# Altium footprint library AMAP4BPXEVBv2.PcbLib: 58 footprints (part 1 of 4)
Each footprint in its own frame and in the unit in brackets; x right, y up, seen from the top. Pads: shape width x height; smd on the part's side, far side on the other; paste and mask are expansions set on the pad; w line width, h text height; cw(c..) or ccw(c..) is an arc to the next point about the centre after c.
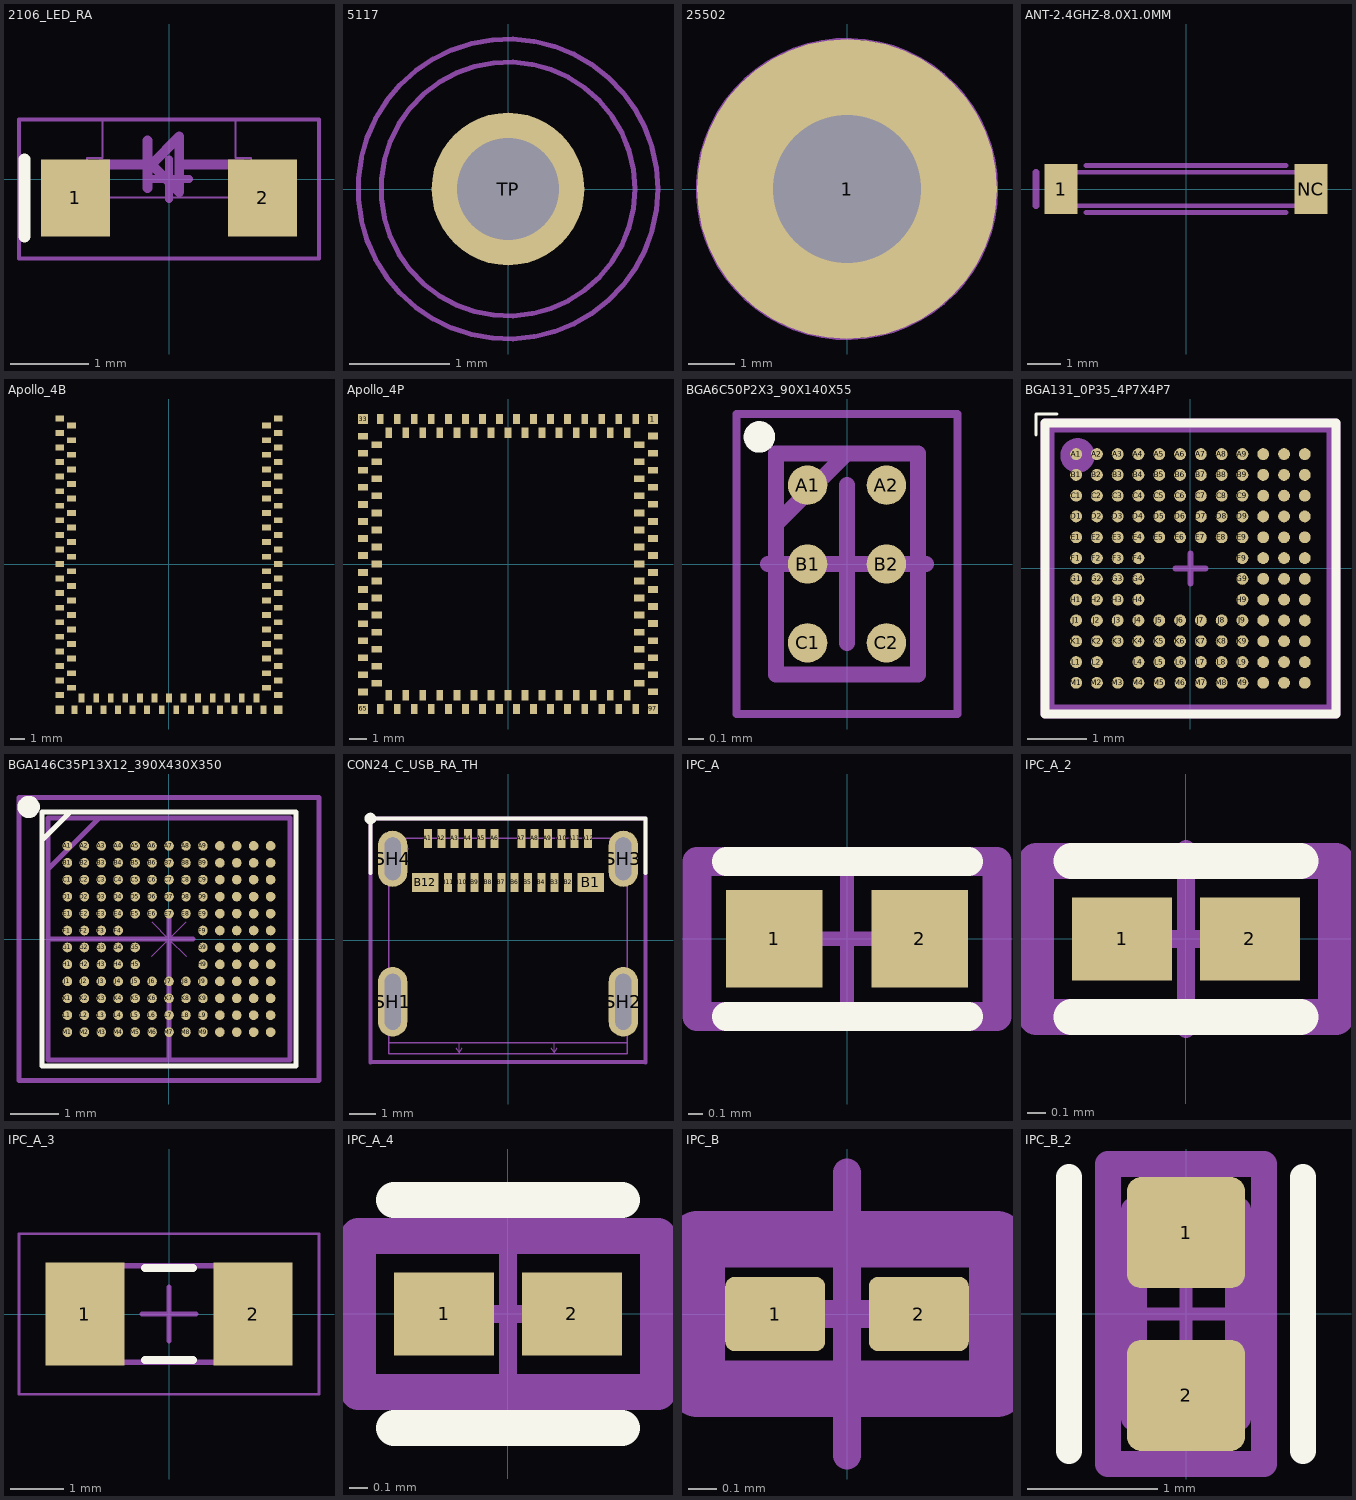
[diagram p0: the footprints below, top view; thin cyan lines are the x and y axes]

## 2106_LED_RA [mil] "2106_LED_RA"
pads (2):
  rect 35x39 smd mask+1.97: 1(-47.2,-9.5) 2(47.2,-9.5)
Top Overlay:
  lines w6: -72.96,-28.96 -72.96,10
  text ".Designator" at -85,-28.5 h40
Top Assembly:
  lines w0.98: -41.49,10.67 -33.49,10.67 ; 33.51,10.67 41.51,10.67
  lines w1: -41.49,10.67 -41.49,-9.33 41.51,-9.33 41.51,10.67 ; -33.49,10.67 -33.49,29.67 33.51,29.67 33.51,10.67
  lines w5: -34.83,7.44 -8.83,7.44 ; -10.83,-4.56 -10.83,7.44 -10.83,19.44 ; 7.17,7.44 37.17,7.44 ; -8.83,7.44 5.17,-6.56 5.17,21.44 -8.83,7.44
  text ".Designator" at 9.05,-132.63 h40
Top Courtyard:
  lines w2: -75.7,-40 -75.7,30 75.7,30 75.7,-40 -75.7,-40
Top Component Center:
  lines w4: -10,0 10,0 ; 0,-10 0,10
3D body "APA2107.STEP": height 23.62, standoff 0, extent -41.34,-9.88 41.34,29.53

## 5117 [mm] "Through hole test point footprint"
pads (1):
  round 1.528 hole 1.02: TP(0,0)
Top Overlay:
  text ".Designator" at 1.143,-0.109 h0.5
Top Assembly:
  circle w0.05: c0,0 r1.27
  text ".Designator" at -0.432,-0.084 h0.5
Top Courtyard:
  circle w0.05: c0,0 r1.5
Top Component Center:
  lines w0.02: -0.052,-0.052 0,0 ; -0.052,0.052 0,0 ; 0.052,-0.052 0,0 ; 0.052,0.052 0,0
3D body "5117.STEP": height 3.18, standoff -4.44, extent -1.261,-1.27 1.279,1.27

## 25502 [mm] "Hex Standoff Threaded M3 Nylon 0.472\" (12.00mm) Natural"
height 12
pads (1):
  round 6.5 hole 3.2: 1(0,0)
Top Assembly:
  circle w0.05: c0,0 r3.25
  text "'.Designator'" at -0.762,1.686 h1
  text "M3 Standoff" at -2.413,-0.624 h1
Mechanical 3:
  circle w0.05: c0,0 r3.25
  circle w0.05: c0,0 r1.6
Top Courtyard:
  circle w0.05: c0,0 r3.25
Top Component Center:
  lines w0.1: -0.354,-0.354 0,0 ; -0.354,0.354 0,0 ; 0.354,-0.354 0,0 ; 0.354,0.354 0,0
3D body "keystone-PN25502.STEP": height 7, standoff -13, extent -2.887,-2.5 2.887,2.5

## ANT-2.4GHZ-8.0X1.0MM [mm] "ANT-2.4GHZ-8.0X1.0MM"
pads (2):
  rect 1x1.5 smd: 1(-3.75,0) NC(3.75,0)
Mechanical 3:
  lines w0.127: -4,-0.5 -4,0.5 4,0.5 4,-0.5 -4,-0.5
Mechanical 7:
  lines w0.152: -3,-0.7 3,-0.7 ; -3,0.7 3,0.7
  lines w0.203: -4.5,-0.5 -4.5,0.5
3D body "3sAp-L1.step": height 1, standoff 0, extent -4.85,-1 4.65,1.1

## Apollo_4B [mm]
pads (107):
  rect 0.6x0.4 smd: 0(-7.5,10) 1(-6.7,9.5) 2(-7.5,9) 3(-6.7,8.5) 4(-7.5,8) 5(-6.7,7.5) 6(-7.5,7) 7(-6.7,6.5) 8(-7.5,6) 9(-6.7,5.5) 10(-7.5,5) 11(-6.7,4.5) 12(-7.5,4) 13(-6.7,3.5) 14(-7.5,3) 15(-6.7,2.5) 16(-7.5,2) 17(-6.7,1.5) 18(-7.5,1) 19(-6.7,0.5) 20(-7.5,0) 21(-6.7,-0.5) 22(-7.5,-1) 23(-6.7,-1.5) 24(-7.5,-2) 25(-6.7,-2.5) 26(-7.5,-3) 27(-6.7,-3.5) 28(-7.5,-4) 29(-6.7,-4.5) 30(-7.5,-5) 31(-6.7,-5.5) 32(-7.5,-6) 33(-6.7,-6.5) 34(-7.5,-7) 35(-6.7,-7.5) 36(-7.5,-8) 37(-6.7,-8.5) 38(-7.5,-9) 68(7.5,-9) 69(6.7,-8.5) 70(7.5,-8) 71(6.7,-7.5) 72(7.5,-7) 73(6.7,-6.5) 74(7.5,-6) 75(6.7,-5.5) 76(7.5,-5) 77(6.7,-4.5) 78(7.5,-4) 79(6.7,-3.5) 80(7.5,-3) 81(6.7,-2.5) 82(7.5,-2) 83(6.7,-1.5) 84(7.5,-1) 85(6.7,-0.5) 86(7.5,0) 87(6.7,0.5) 88(7.5,1) 89(6.7,1.5) 90(7.5,2) 91(6.7,2.5) 92(7.5,3) 93(6.7,3.5) 94(7.5,4) 95(6.7,4.5) 96(7.5,5) 97(6.7,5.5) 98(7.5,6) 99(6.7,6.5) 100(7.5,7) 101(6.7,7.5) 102(7.5,8) 103(6.7,8.5) 104(7.5,9) 105(6.7,9.5) 106(7.5,10)
  rect 0.6x0.6 smd: 39(-7.5,-10) 67(7.5,-10)
  rect 0.4x0.6 smd: 40(-6.5,-10) 41(-6,-9.2) 42(-5.5,-10) 43(-5,-9.2) 44(-4.5,-10) 45(-4,-9.2) 46(-3.5,-10) 47(-3,-9.2) 48(-2.5,-10) 49(-2,-9.2) 50(-1.5,-10) 51(-1,-9.2) 52(-0.5,-10) 53(0,-9.2) 54(0.5,-10) 55(1,-9.2) 56(1.5,-10) 57(2,-9.2) 58(2.5,-10) 59(3,-9.2) 60(3.5,-10) 61(4,-9.2) 62(4.5,-10) 63(5,-9.2) 64(5.5,-10) 65(6,-9.2) 66(6.5,-10)

## Apollo_4P [mm]
pads (128):
  rect 0.6x0.6 smd: 1(8.5,8.5) 33(-8.5,8.5) 65(-8.5,-8.5) 97(8.5,-8.5)
  rect 0.4x0.6 smd: 2(7.5,8.5) 3(7,7.7) 4(6.5,8.5) 5(6,7.7) 6(5.5,8.5) 7(5,7.7) 8(4.5,8.5) 9(4,7.7) 10(3.5,8.5) 11(3,7.7) 12(2.5,8.5) 13(2,7.7) 14(1.5,8.5) 15(1,7.7) 16(0.5,8.5) 17(0,7.7) 18(-0.5,8.5) 19(-1,7.7) 20(-1.5,8.5) 21(-2,7.7) 22(-2.5,8.5) 23(-3,7.7) 24(-3.5,8.5) 25(-4,7.7) 26(-4.5,8.5) 27(-5,7.7) 28(-5.5,8.5) 29(-6,7.7) 30(-6.5,8.5) 31(-7,7.7) 32(-7.5,8.5) 66(-7.5,-8.5) 67(-7,-7.7) 68(-6.5,-8.5) 69(-6,-7.7) 70(-5.5,-8.5) 71(-5,-7.7) 72(-4.5,-8.5) 73(-4,-7.7) 74(-3.5,-8.5) 75(-3,-7.7) 76(-2.5,-8.5) 77(-2,-7.7) 78(-1.5,-8.5) 79(-1,-7.7) 80(-0.5,-8.5) 81(0,-7.7) 82(0.5,-8.5) 83(1,-7.7) 84(1.5,-8.5) 85(2,-7.7) 86(2.5,-8.5) 87(3,-7.7) 88(3.5,-8.5) 89(4,-7.7) 90(4.5,-8.5) 91(5,-7.7) 92(5.5,-8.5) 93(6,-7.7) 94(6.5,-8.5) 95(7,-7.7) 96(7.5,-8.5)
  rect 0.6x0.4 smd: 34(-8.5,7.5) 35(-7.7,7) 36(-8.5,6.5) 37(-7.7,6) 38(-8.5,5.5) 39(-7.7,5) 40(-8.5,4.5) 41(-7.7,4) 42(-8.5,3.5) 43(-7.7,3) 44(-8.5,2.5) 45(-7.7,2) 46(-8.5,1.5) 47(-7.7,1) 48(-8.5,0.5) 49(-7.7,0) 50(-8.5,-0.5) 51(-7.7,-1) 52(-8.5,-1.5) 53(-7.7,-2) 54(-8.5,-2.5) 55(-7.7,-3) 56(-8.5,-3.5) 57(-7.7,-4) 58(-8.5,-4.5) 59(-7.7,-5) 60(-8.5,-5.5) 61(-7.7,-6) 62(-8.5,-6.5) 63(-7.7,-7) 64(-8.5,-7.5) 98(8.5,-7.5) 99(7.7,-7) 100(8.5,-6.5) 101(7.7,-6) 102(8.5,-5.5) 103(7.7,-5) 104(8.5,-4.5) 105(7.7,-4) 106(8.5,-3.5) 107(7.7,-3) 108(8.5,-2.5) 109(7.7,-2) 110(8.5,-1.5) 111(7.7,-1) 112(8.5,-0.5) 113(7.7,0) 114(8.5,0.5) 115(7.7,1) 116(8.5,1.5) 117(7.7,2) 118(8.5,2.5) 119(7.7,3) 120(8.5,3.5) 121(7.7,4) 122(8.5,4.5) 123(7.7,5) 124(8.5,5.5) 125(7.7,6) 126(8.5,6.5) 127(7.7,7) 128(8.5,7.5)

## BGA6C50P2X3_90X140X55 [mm] "BGA, 6-Leads, Body 0.90x1.40mmx0.55mm, Pitch 0.50mm"
height 0.56
pads (6):
  round 0.25 smd mask+0.05: A1(-0.25,0.5) A2(0.25,0.5) B1(-0.25,0) B2(0.25,0) C1(-0.25,-0.5) C2(0.25,-0.5)
Top Overlay:
  circle w0.1: c-0.555,0.805 r0.05
  text ".Designator" at 0.103,-2.71 h1.02
Top Assembly:
  lines w0.1: -0.45,-0.7 0.45,-0.7 0.45,0.7 -0.45,0.7 -0.45,-0.7
  lines w0.102: -0.448,0.254 0,0.7
  text ".Designator" at 0.139,-2.464 h1.02
Top Courtyard:
  lines w0.05: -0.7,-0.95 0.7,-0.95 0.7,0.95 -0.7,0.95 -0.7,-0.95
Top Component Center:
  lines w0.1: -0.5,0 0.5,0 ; 0,-0.5 0,0.5
3D body "BGA6C50P2X3_90X140X55.step": height 0.55, standoff 0, extent -0.45,-0.7 0.45,0.7

## BGA131_0P35_4P7X4P7 [mm] "BGA131_0P35_4P7X4P7"
pads (131):
  round 0.2 smd mask+0.03: A1(-1.925,1.925) A2(-1.575,1.925) A3(-1.225,1.925) A4(-0.875,1.925) A5(-0.525,1.925) A6(-0.175,1.925) A7(0.175,1.925) A8(0.525,1.925) A9(0.875,1.925) A10(1.225,1.925) A11(1.575,1.925) A12(1.925,1.925) B1(-1.925,1.575) B2(-1.575,1.575) B3(-1.225,1.575) B4(-0.875,1.575) B5(-0.525,1.575) B6(-0.175,1.575) B7(0.175,1.575) B8(0.525,1.575) B9(0.875,1.575) B10(1.225,1.575) B11(1.575,1.575) B12(1.925,1.575) C1(-1.925,1.225) C2(-1.575,1.225) C3(-1.225,1.225) C4(-0.875,1.225) C5(-0.525,1.225) C6(-0.175,1.225) C7(0.175,1.225) C8(0.525,1.225) C9(0.875,1.225) C10(1.225,1.225) C11(1.575,1.225) C12(1.925,1.225) D1(-1.925,0.875) D2(-1.575,0.875) D3(-1.225,0.875) D4(-0.875,0.875) D5(-0.525,0.875) D6(-0.175,0.875) D7(0.175,0.875) D8(0.525,0.875) D9(0.875,0.875) D10(1.225,0.875) D11(1.575,0.875) D12(1.925,0.875) E1(-1.925,0.525) E2(-1.575,0.525) E3(-1.225,0.525) E4(-0.875,0.525) E5(-0.525,0.525) E6(-0.175,0.525) E7(0.175,0.525) E8(0.525,0.525) E9(0.875,0.525) E10(1.225,0.525) E11(1.575,0.525) E12(1.925,0.525) F1(-1.925,0.175) F2(-1.575,0.175) F3(-1.225,0.175) F4(-0.875,0.175) F9(0.875,0.175) F10(1.225,0.175) F11(1.575,0.175) F12(1.925,0.175) G1(-1.925,-0.175) G2(-1.575,-0.175) G3(-1.225,-0.175) G4(-0.875,-0.175) G9(0.875,-0.175) G10(1.225,-0.175) G11(1.575,-0.175) G12(1.925,-0.175) H1(-1.925,-0.525) H2(-1.575,-0.525) H3(-1.225,-0.525) H4(-0.875,-0.525) H9(0.875,-0.525) H10(1.225,-0.525) H11(1.575,-0.525) H12(1.925,-0.525) J1(-1.925,-0.875) J2(-1.575,-0.875) J3(-1.225,-0.875) J4(-0.875,-0.875) J5(-0.525,-0.875) J6(-0.175,-0.875) J7(0.175,-0.875) J8(0.525,-0.875) J9(0.875,-0.875) J10(1.225,-0.875) J11(1.575,-0.875) J12(1.925,-0.875) K1(-1.925,-1.225) K2(-1.575,-1.225) K3(-1.225,-1.225) K4(-0.875,-1.225) K5(-0.525,-1.225) K6(-0.175,-1.225) K7(0.175,-1.225) K8(0.525,-1.225) K9(0.875,-1.225) K10(1.225,-1.225) K11(1.575,-1.225) K12(1.925,-1.225) L1(-1.925,-1.575) L2(-1.575,-1.575) L4(-0.875,-1.575) L5(-0.525,-1.575) L6(-0.175,-1.575) L7(0.175,-1.575) L8(0.525,-1.575) L9(0.875,-1.575) L10(1.225,-1.575) L11(1.575,-1.575) L12(1.925,-1.575) M1(-1.925,-1.925) M2(-1.575,-1.925) M3(-1.225,-1.925) M4(-0.875,-1.925) M5(-0.525,-1.925) M6(-0.175,-1.925) M7(0.175,-1.925) M8(0.525,-1.925) M9(0.875,-1.925) M10(1.225,-1.925) M11(1.575,-1.925) M12(1.925,-1.925)
Top Overlay:
  lines w0.05: -2.6,2.25 -2.6,2.6 -2.25,2.6
  lines w0.152: -2.45,-2.45 -2.45,2.45 2.45,2.45 2.45,-2.45 -2.45,-2.45
  text ".Designator" at 2.678,-2.983 h3.81
Top Assembly:
  circle w0.381: c-1.901,1.901 r0.1
  lines w0.127: -2.35,-2.35 -2.35,2.35 2.35,2.35 2.35,-2.35 -2.35,-2.35
  text ".Designator" at 0.142,2.336 h1.02
Top Courtyard:
  lines w0.152: -2.45,-2.45 -2.45,2.45 2.45,2.45 2.45,-2.45 -2.45,-2.45
Top Component Center:
  lines w0.102: -0.254,0 0.254,0 ; 0,-0.254 0,0.254
3D body: height 0.5, standoff 0, extent -2.45,-2.45 2.45,2.45

## BGA146C35P13X12_390X430X350 [mm] "BGA, 146-Leads, Body 3.91x4.31mmx3.50mm, Pitch 0.35mm"
height 3.5
pads (146):
  round 0.2 smd paste+0 mask+0.03: A1(-2.1,1.925) A2(-1.75,1.925) A3(-1.4,1.925) A4(-1.05,1.925) A5(-0.7,1.925) A6(-0.35,1.925) A7(0,1.925) A8(0.35,1.925) A9(0.7,1.925) A10(1.05,1.925) A11(1.4,1.925) A12(1.75,1.925) A13(2.1,1.925) B1(-2.1,1.575) B2(-1.75,1.575) B3(-1.4,1.575) B4(-1.05,1.575) B5(-0.7,1.575) B6(-0.35,1.575) B7(0,1.575) B8(0.35,1.575) B9(0.7,1.575) B10(1.05,1.575) B11(1.4,1.575) B12(1.75,1.575) B13(2.1,1.575) C1(-2.1,1.225) C2(-1.75,1.225) C3(-1.4,1.225) C4(-1.05,1.225) C5(-0.7,1.225) C6(-0.35,1.225) C7(0,1.225) C8(0.35,1.225) C9(0.7,1.225) C10(1.05,1.225) C11(1.4,1.225) C12(1.75,1.225) C13(2.1,1.225) D1(-2.1,0.875) D2(-1.75,0.875) D3(-1.4,0.875) D4(-1.05,0.875) D5(-0.7,0.875) D6(-0.35,0.875) D7(0,0.875) D8(0.35,0.875) D9(0.7,0.875) D10(1.05,0.875) D11(1.4,0.875) D12(1.75,0.875) D13(2.1,0.875) E1(-2.1,0.525) E2(-1.75,0.525) E3(-1.4,0.525) E4(-1.05,0.525) E5(-0.7,0.525) E6(-0.35,0.525) E7(0,0.525) E8(0.35,0.525) E9(0.7,0.525) E10(1.05,0.525) E11(1.4,0.525) E12(1.75,0.525) E13(2.1,0.525) F1(-2.1,0.175) F2(-1.75,0.175) F3(-1.4,0.175) F4(-1.05,0.175) F9(0.7,0.175) F10(1.05,0.175) F11(1.4,0.175) F12(1.75,0.175) F13(2.1,0.175) G1(-2.1,-0.175) G2(-1.75,-0.175) G3(-1.4,-0.175) G4(-1.05,-0.175) G5(-0.7,-0.175) G9(0.7,-0.175) G10(1.05,-0.175) G11(1.4,-0.175) G12(1.75,-0.175) G13(2.1,-0.175) H1(-2.1,-0.525) H2(-1.75,-0.525) H3(-1.4,-0.525) H4(-1.05,-0.525) H5(-0.7,-0.525) H9(0.7,-0.525) H10(1.05,-0.525) H11(1.4,-0.525) H12(1.75,-0.525) H13(2.1,-0.525) J1(-2.1,-0.875) J2(-1.75,-0.875) J3(-1.4,-0.875) J4(-1.05,-0.875) J5(-0.7,-0.875) J6(-0.35,-0.875) J7(0,-0.875) J8(0.35,-0.875) J9(0.7,-0.875) J10(1.05,-0.875) J11(1.4,-0.875) J12(1.75,-0.875) J13(2.1,-0.875) K1(-2.1,-1.225) K2(-1.75,-1.225) K3(-1.4,-1.225) K4(-1.05,-1.225) K5(-0.7,-1.225) K6(-0.35,-1.225) K7(0,-1.225) K8(0.35,-1.225) K9(0.7,-1.225) K10(1.05,-1.225) K11(1.4,-1.225) K12(1.75,-1.225) K13(2.1,-1.225) L1(-2.1,-1.575) L2(-1.75,-1.575) L3(-1.4,-1.575) L4(-1.05,-1.575) L5(-0.7,-1.575) L6(-0.35,-1.575) L7(0,-1.575) L8(0.35,-1.575) L9(0.7,-1.575) L10(1.05,-1.575) L11(1.4,-1.575) L12(1.75,-1.575) L13(2.1,-1.575) M1(-2.1,-1.925) M2(-1.75,-1.925) M3(-1.4,-1.925) M4(-1.05,-1.925) M5(-0.7,-1.925) M6(-0.35,-1.925) M7(0,-1.925) M8(0.35,-1.925) M9(0.7,-1.925) M10(1.05,-1.925) M11(1.4,-1.925) M12(1.75,-1.925) M13(2.1,-1.925)
Top Overlay:
  circle w0.25: c-2.899,2.73 r0.106
  lines w0.102: -2.625,2.051 -2.615,2.051 -2.042,2.625 -2.048,2.625 ; -2.625,-2.625 -2.625,2.625 2.625,2.625 2.625,-2.625 -2.625,-2.625
  text ".Designator" at 3.568,-0.339 h1.52
Top Assembly:
  lines w0.102: -2.5,1.444 -1.447,2.497 ; -2.282,2.5 -2.276,2.5 ; -2.5,-2.5 -2.5,0 0,0 0,-2.5 -2.5,-2.5 ; -2.5,-2.5 -2.5,2.5 2.5,2.5 2.5,-2.5 -2.5,-2.5
  text "MRAM Location Quadrant" at -2.511,-2.5 h0.51
  text ".Designator" at 1.074,-0.654 h1
Top Courtyard:
  lines w0.102: -3.1,-2.925 -3.1,2.925 3.1,2.925 3.1,-2.925 -3.1,-2.925
Top Component Center:
  lines w0.025: -0.354,-0.354 0,0 ; -0.354,0.354 0,0 ; 0.354,-0.354 0,0 ; 0.354,0.354 0,0
  lines w0.1: -0.5,0 0,0 ; 0,-0.5 0,0 ; 0,0.5 0,0 ; 0.5,0 0,0
3D body: height 0.4, standoff 0, extent 0.15,0.325 0.55,0.725
3D body: height 0.4, standoff 0, extent 0.15,0.675 0.55,1.075
3D body: height 0.4, standoff 0, extent 0.5,-0.025 0.9,0.375
3D body: height 0.4, standoff 0, extent 0.5,0.325 0.9,0.725
3D body: height 0.4, standoff 0, extent 0.5,0.675 0.9,1.075
3D body: height 0.4, standoff 0, extent 0.5,1.025 0.9,1.425
3D body: height 0.4, standoff 0, extent 0.5,1.375 0.9,1.775
3D body: height 0.4, standoff 0, extent 0.5,1.725 0.9,2.125
3D body: height 0.4, standoff 0, extent 0.5,-0.375 0.9,0.025
3D body: height 0.4, standoff 0, extent 0.5,-0.725 0.9,-0.325
3D body: height 0.4, standoff 0, extent 0.5,-1.075 0.9,-0.675
3D body: height 0.4, standoff 0, extent 0.15,-1.075 0.55,-0.675
3D body: height 0.4, standoff 0, extent -0.2,-1.075 0.2,-0.675
3D body: height 0.4, standoff 0, extent -0.55,-1.075 -0.15,-0.675
3D body: height 0.4, standoff 0, extent -0.9,-1.075 -0.5,-0.675
3D body: height 0.4, standoff 0, extent -0.9,-0.725 -0.5,-0.325
3D body: height 0.4, standoff 0, extent -0.9,-0.375 -0.5,0.025
3D body: height 0.4, standoff 0, extent 1.2,-1.425 1.6,-1.025
3D body: height 0.4, standoff 0, extent 1.2,-1.775 1.6,-1.375
3D body: height 0.4, standoff 0, extent 1.2,-2.125 1.6,-1.725
3D body: height 0.4, standoff 0, extent -0.2,0.325 0.2,0.725
3D body: height 0.4, standoff 0, extent -0.55,0.325 -0.15,0.725
3D body: height 0.4, standoff 0, extent -0.9,0.325 -0.5,0.725
3D body: height 0.4, standoff 0, extent -0.2,0.675 0.2,1.075
3D body: height 0.4, standoff 0, extent -0.55,0.675 -0.15,1.075
3D body: height 0.4, standoff 0, extent -0.9,0.675 -0.5,1.075
3D body: height 0.4, standoff 0, extent 0.85,1.025 1.25,1.425
3D body: height 0.4, standoff 0, extent 0.85,1.375 1.25,1.775
3D body: height 0.4, standoff 0, extent 0.85,1.725 1.25,2.125
3D body: height 0.4, standoff 0, extent 1.2,1.025 1.6,1.425
3D body: height 0.4, standoff 0, extent 1.2,1.375 1.6,1.775
3D body: height 0.4, standoff 0, extent 1.2,1.725 1.6,2.125
3D body: height 0.58, standoff 0.18, extent -2.5,-2.5 2.5,2.5
3D body: height 0.4, standoff 0, extent 1.9,-0.025 2.3,0.375
3D body: height 0.4, standoff 0, extent 1.9,0.325 2.3,0.725
3D body: height 0.4, standoff 0, extent 1.9,0.675 2.3,1.075
3D body: height 0.4, standoff 0, extent 1.55,-0.025 1.95,0.375
3D body: height 0.4, standoff 0, extent 1.55,0.325 1.95,0.725
3D body: height 0.4, standoff 0, extent 1.55,0.675 1.95,1.075
3D body: height 0.4, standoff 0, extent 1.2,-0.025 1.6,0.375
3D body: height 0.4, standoff 0, extent 1.2,0.325 1.6,0.725
3D body: height 0.4, standoff 0, extent 1.2,0.675 1.6,1.075
3D body: height 0.4, standoff 0, extent 0.85,-0.025 1.25,0.375
3D body: height 0.4, standoff 0, extent 0.85,0.325 1.25,0.725
3D body: height 0.4, standoff 0, extent 0.85,0.675 1.25,1.075
3D body: height 0.4, standoff 0, extent 1.9,-1.075 2.3,-0.675
3D body: height 0.4, standoff 0, extent 1.9,-0.725 2.3,-0.325
3D body: height 0.4, standoff 0, extent 1.9,-0.375 2.3,0.025
3D body: height 0.4, standoff 0, extent 1.55,-1.075 1.95,-0.675
3D body: height 0.4, standoff 0, extent 1.55,-0.725 1.95,-0.325
3D body: height 0.4, standoff 0, extent 1.55,-0.375 1.95,0.025
3D body: height 0.4, standoff 0, extent 1.2,-1.075 1.6,-0.675
3D body: height 0.4, standoff 0, extent 1.2,-0.725 1.6,-0.325
3D body: height 0.4, standoff 0, extent 1.2,-0.375 1.6,0.025
3D body: height 0.4, standoff 0, extent 0.85,-1.075 1.25,-0.675
3D body: height 0.4, standoff 0, extent 0.85,-0.725 1.25,-0.325
3D body: height 0.4, standoff 0, extent 0.85,-0.375 1.25,0.025
3D body: height 0.4, standoff 0, extent 0.85,-2.125 1.25,-1.725
3D body: height 0.4, standoff 0, extent 0.85,-1.775 1.25,-1.375
3D body: height 0.4, standoff 0, extent 0.85,-1.425 1.25,-1.025
3D body: height 0.4, standoff 0, extent 0.5,-2.125 0.9,-1.725
3D body: height 0.4, standoff 0, extent 0.5,-1.775 0.9,-1.375
3D body: height 0.4, standoff 0, extent 0.5,-1.425 0.9,-1.025
3D body: height 0.4, standoff 0, extent 0.15,-2.125 0.55,-1.725
3D body: height 0.4, standoff 0, extent 0.15,-1.775 0.55,-1.375
3D body: height 0.4, standoff 0, extent 0.15,-1.425 0.55,-1.025
3D body: height 0.4, standoff 0, extent -0.2,-2.125 0.2,-1.725
3D body: height 0.4, standoff 0, extent -0.2,-1.775 0.2,-1.375
3D body: height 0.4, standoff 0, extent -0.2,-1.425 0.2,-1.025
3D body: height 0.4, standoff 0, extent -0.55,-2.125 -0.15,-1.725
3D body: height 0.4, standoff 0, extent -0.55,-1.775 -0.15,-1.375
3D body: height 0.4, standoff 0, extent -0.55,-1.425 -0.15,-1.025
3D body: height 0.4, standoff 0, extent -0.9,-2.125 -0.5,-1.725
3D body: height 0.4, standoff 0, extent -0.9,-1.775 -0.5,-1.375
3D body: height 0.4, standoff 0, extent -0.9,-1.425 -0.5,-1.025
3D body: height 0.4, standoff 0, extent -1.25,-2.125 -0.85,-1.725
3D body: height 0.4, standoff 0, extent -1.25,-1.775 -0.85,-1.375
3D body: height 0.4, standoff 0, extent -1.25,-1.425 -0.85,-1.025
3D body: height 0.4, standoff 0, extent -1.6,-2.125 -1.2,-1.725
3D body: height 0.4, standoff 0, extent -1.6,-1.775 -1.2,-1.375
3D body: height 0.4, standoff 0, extent -1.6,-1.425 -1.2,-1.025
3D body: height 0.4, standoff 0, extent -1.25,-1.075 -0.85,-0.675
3D body: height 0.4, standoff 0, extent -1.25,-0.725 -0.85,-0.325
3D body: height 0.4, standoff 0, extent -1.25,-0.375 -0.85,0.025
3D body: height 0.4, standoff 0, extent -1.6,-1.075 -1.2,-0.675
3D body: height 0.4, standoff 0, extent -1.6,-0.725 -1.2,-0.325
3D body: height 0.4, standoff 0, extent -1.6,-0.375 -1.2,0.025
3D body: height 0.4, standoff 0, extent -1.95,-1.075 -1.55,-0.675
3D body: height 0.4, standoff 0, extent -1.95,-0.725 -1.55,-0.325
3D body: height 0.4, standoff 0, extent -1.95,-0.375 -1.55,0.025
3D body: height 0.4, standoff 0, extent -2.3,-1.075 -1.9,-0.675
3D body: height 0.4, standoff 0, extent -2.3,-0.725 -1.9,-0.325
3D body: height 0.4, standoff 0, extent -2.3,-0.375 -1.9,0.025
3D body: height 0.4, standoff 0, extent -1.25,-0.025 -0.85,0.375
3D body: height 0.4, standoff 0, extent -1.25,0.325 -0.85,0.725
3D body: height 0.4, standoff 0, extent -1.25,0.675 -0.85,1.075
3D body: height 0.4, standoff 0, extent -1.6,-0.025 -1.2,0.375
3D body: height 0.4, standoff 0, extent -1.6,0.325 -1.2,0.725
3D body: height 0.4, standoff 0, extent -1.6,0.675 -1.2,1.075
3D body: height 0.4, standoff 0, extent -1.95,-0.025 -1.55,0.375
3D body: height 0.4, standoff 0, extent -1.95,0.325 -1.55,0.725
3D body: height 0.4, standoff 0, extent -1.95,0.675 -1.55,1.075
3D body: height 0.4, standoff 0, extent -2.3,-0.025 -1.9,0.375
3D body: height 0.4, standoff 0, extent -2.3,0.325 -1.9,0.725
3D body: height 0.4, standoff 0, extent -2.3,0.675 -1.9,1.075
3D body: height 0.4, standoff 0, extent 0.15,1.025 0.55,1.425
3D body: height 0.4, standoff 0, extent 0.15,1.375 0.55,1.775
3D body: height 0.4, standoff 0, extent 0.15,1.725 0.55,2.125
3D body: height 0.4, standoff 0, extent -0.2,1.025 0.2,1.425
3D body: height 0.4, standoff 0, extent -0.2,1.375 0.2,1.775
3D body: height 0.4, standoff 0, extent -0.2,1.725 0.2,2.125
3D body: height 0.4, standoff 0, extent -0.55,1.025 -0.15,1.425
3D body: height 0.4, standoff 0, extent -0.55,1.375 -0.15,1.775
3D body: height 0.4, standoff 0, extent -0.55,1.725 -0.15,2.125
3D body: height 0.4, standoff 0, extent -0.9,1.025 -0.5,1.425
3D body: height 0.4, standoff 0, extent -0.9,1.375 -0.5,1.775
3D body: height 0.4, standoff 0, extent -0.9,1.725 -0.5,2.125
3D body: height 0.4, standoff 0, extent -1.25,1.025 -0.85,1.425
3D body: height 0.4, standoff 0, extent -1.25,1.375 -0.85,1.775
3D body: height 0.4, standoff 0, extent -1.25,1.725 -0.85,2.125
3D body: height 0.4, standoff 0, extent -1.6,1.025 -1.2,1.425
3D body: height 0.4, standoff 0, extent -1.6,1.375 -1.2,1.775
3D body: height 0.4, standoff 0, extent -1.6,1.725 -1.2,2.125
3D body: height 0.4, standoff 0, extent 1.55,-1.425 1.95,-1.025
3D body: height 0.4, standoff 0, extent 1.55,-1.775 1.95,-1.375
3D body: height 0.4, standoff 0, extent 1.55,-2.125 1.95,-1.725
3D body: height 0.4, standoff 0, extent 1.9,-1.425 2.3,-1.025
3D body: height 0.4, standoff 0, extent 1.9,-1.775 2.3,-1.375
3D body: height 0.4, standoff 0, extent 1.9,-2.125 2.3,-1.725
3D body: height 0.4, standoff 0, extent -1.95,1.025 -1.55,1.425
3D body: height 0.4, standoff 0, extent -1.95,1.375 -1.55,1.775
3D body: height 0.4, standoff 0, extent -1.95,1.725 -1.55,2.125
3D body: height 0.4, standoff 0, extent -2.3,1.025 -1.9,1.425
3D body: height 0.4, standoff 0, extent -2.3,1.375 -1.9,1.775
3D body: height 0.4, standoff 0, extent -2.3,1.725 -1.9,2.125
3D body: height 0.4, standoff 0, extent -1.95,-1.425 -1.55,-1.025
3D body: height 0.4, standoff 0, extent -1.95,-1.775 -1.55,-1.375
3D body: height 0.4, standoff 0, extent -1.95,-2.125 -1.55,-1.725
3D body: height 0.4, standoff 0, extent -2.3,-1.425 -1.9,-1.025
3D body: height 0.4, standoff 0, extent -2.3,-1.775 -1.9,-1.375
3D body: height 0.4, standoff 0, extent -2.3,-2.125 -1.9,-1.725
3D body: height 0.4, standoff 0, extent 1.55,1.025 1.95,1.425
3D body: height 0.4, standoff 0, extent 1.55,1.375 1.95,1.775
3D body: height 0.4, standoff 0, extent 1.55,1.725 1.95,2.125
3D body: height 0.4, standoff 0, extent 1.9,1.025 2.3,1.425
3D body: height 0.4, standoff 0, extent 1.9,1.375 2.3,1.775
3D body: height 0.4, standoff 0, extent 1.9,1.725 2.3,2.125

## CON24_C_USB_RA_TH [mm] "CON24_C_USB_RA_TH"
pads (28):
  rect 0.3x0.701 smd mask+0.051: A1(-3,3.813) A2(-2.499,3.813) A3(-2.002,3.813) A4(-1.501,3.813) A5(-1.001,3.813) A6(-0.5,3.813) A7(0.5,3.813) A8(1.001,3.813) A9(1.499,3.813) A10(1.999,3.813) A11(2.499,3.813) A12(3,3.813) B2(2.25,2.164) B3(1.75,2.164) B4(1.25,2.164) B5(0.749,2.164) B6(0.251,2.164) B7(-0.249,2.164) B8(-0.749,2.164) B9(-1.25,2.164) B10(-1.75,2.164) B11(-2.248,2.164)
  rect 1.001x0.701 smd mask+0.051: B1(3.099,2.164) B12(-3.099,2.164)
  oval 1.1x2.6 hole 0.6 slot 2.1 at 90 deg mask+0.051: SH1(-4.321,-2.306) SH2(4.321,-2.306)
  oval 1.1x2.1 hole 0.6 slot 1.6 at 90 deg mask+0.051: SH3(4.321,3.053) SH4(-4.321,3.053)
Top Overlay:
  circle w0.2: c-5.156,4.559 r0.119
  lines w0.152: -5.156,2.527 -5.156,4.559 5.156,4.559 5.156,2.527
  text ".Designator" at -5.41,4.813 h1.02
Top Assembly:
  circle w0.025: c-4.064,3.429 r0.32
  lines w0.025: -1.95,-4.034 -1.829,-4.216 ; -1.829,-3.884 -1.829,-4.216 ; -1.708,-4.035 -1.829,-4.216 ; 1.609,-4.03 1.731,-4.211 ; 1.731,-3.88 1.731,-4.211 ; 1.852,-4.031 1.731,-4.211
  lines w0.051: -4.47,-3.834 4.47,-3.834 ; -4.47,-4.257 -4.47,3.823 4.47,3.823 4.47,-4.257 -4.47,-4.257
  text "PCB EDGE" at -1.237,-4.231 h0.55
  text ".Designator" at 0.063,-2.15 h1.02
Top Courtyard:
  lines w0.152: -5.156,-4.585 -5.156,4.559 5.156,4.559 5.156,-4.585 ; -5.156,-4.559 5.156,-4.559
3D body "1054500101.stp": height 3.28, standoff -0.68, extent -4.466,-4.077 4.474,3.823

## IPC_A [mm]
pads (2):
  rect 0.668x0.672 smd mask+0.051: 1(-0.502,0) 2(0.502,0)
Top Overlay:
  lines w0.2: -0.834,-0.537 0.839,-0.537 ; -0.834,0.536 0.839,0.536
  text ".Designator" at 1.118,-0.143 h1
Top Assembly:
  lines w0.2: -1.036,-0.536 -1.036,0.536 1.036,0.536 1.036,-0.536 -1.036,-0.536
  text ".Designator" at -0.633,-0.123 h1
Top Courtyard:
  lines w0.2: -1.036,-0.536 -1.036,0.536 1.036,0.536 1.036,-0.536 -1.036,-0.536
Top Component Center:
  lines w0.1: -0.5,0 0.5,0 ; 0,-0.5 0,0.5
3D body: height 0.4, standoff 0, extent -0.275,-0.275 0.275,0.275
3D body: height 0.4, standoff 0, extent -0.525,-0.275 -0.275,0.275
3D body: height 0.4, standoff 0, extent 0.275,-0.275 0.525,0.275

## IPC_A_2 [mm]
pads (2):
  rect 0.554x0.463 smd mask+0.025: 1(-0.354,0) 2(0.354,0)
Top Overlay:
  lines w0.2: -0.635,-0.432 0.635,-0.432 ; -0.635,0.432 0.635,0.432
  text ".Designator" at 2.252,-0.79 h1
Top Assembly:
  lines w0.2: -0.831,-0.431 -0.831,0.431 0.831,0.431 0.831,-0.431 -0.831,-0.431
  text ".Designator" at 2.159,-0.785 h1
Top Courtyard:
  lines w0.2: -0.831,-0.431 -0.831,0.431 0.831,0.431 0.831,-0.431 -0.831,-0.431
Top Component Center:
  lines w0.1: -0.5,0 0.5,0 ; 0,-0.5 0,0.5
3D body: height 0.33, standoff 0, extent -0.165,-0.165 0.165,0.165
3D body: height 0.33, standoff 0, extent -0.315,-0.165 -0.165,0.165
3D body: height 0.33, standoff 0, extent 0.165,-0.165 0.315,0.165

## IPC_A_3 [mm]
pads (2):
  rect 1.47x1.92 smd: 1(-1.57,0) 2(1.57,0)
Top Overlay:
  lines w0.152: -0.45,-0.86 0.45,-0.86 ; -0.45,0.86 0.45,0.86
Top Assembly:
  lines w0.1: -1.75,-0.9 1.75,-0.9 1.75,0.9 -1.75,0.9 -1.75,-0.9
  text ".Designator" at -1.145,-0.115 h0.51
Top Courtyard:
  lines w0.05: -2.8,-1.5 2.8,-1.5 2.8,1.5 -2.8,1.5 -2.8,-1.5
Top Component Center:
  lines w0.1: -0.5,0 0.5,0 ; 0,-0.5 0,0.5
3D body "INDC3216X11M.step": height 1.1, standoff 0, extent -1.75,-0.9 1.75,0.9

## IPC_A_4 [mm]
pads (2):
  rect 0.554x0.463 smd mask+0.025: 1(-0.354,0) 2(0.354,0)
Top Overlay:
  lines w0.2: -0.631,-0.631 0.631,-0.631 ; -0.631,0.631 0.631,0.631
Top Assembly:
  lines w0.2: -0.831,-0.431 -0.831,0.431 0.831,0.431 0.831,-0.431 -0.831,-0.431
  text ".Designator" at -0.713,0.975 h1
Top Courtyard:
  lines w0.2: -0.831,-0.431 -0.831,0.431 0.831,0.431 0.831,-0.431 -0.831,-0.431
Top Component Center:
  lines w0.1: -0.5,0 0.5,0 ; 0,-0.5 0,0.5
3D body: height 0.33, standoff 0, extent -0.165,-0.165 0.165,0.165
3D body: height 0.33, standoff 0, extent -0.315,-0.165 -0.165,0.165
3D body: height 0.33, standoff 0, extent 0.165,-0.165 0.315,0.165

## IPC_B [mm]
pads (2):
  rrect25% 0.354x0.263 smd mask+0.025: 1(-0.254,0) 2(0.254,0)
Top Overlay:
  text ".Designator" at -0.605,-0.316 h1.02
Top Assembly:
  lines w0.2: -0.531,-0.265 -0.531,0.265 0.531,0.265 0.531,-0.265 -0.531,-0.265
  text ".Designator" at -1.252,-1.576 h1
Top Courtyard:
  lines w0.2: -0.531,-0.265 -0.531,0.265 0.531,0.265 0.531,-0.265 -0.531,-0.265
Top Component Center:
  lines w0.1: -0.5,0 0.5,0 ; 0,-0.5 0,0.5
3D body: height 0.33, standoff 0, extent -0.165,-0.165 0.165,0.165
3D body: height 0.33, standoff 0, extent -0.315,-0.165 -0.165,0.165
3D body: height 0.33, standoff 0, extent 0.165,-0.165 0.315,0.165

## IPC_B_2 [mm]
pads (2):
  rrect25% 0.906x0.855 smd paste+0 mask+0: 1(0,0.626) 2(0,-0.626)
Top Overlay:
  lines w0.2: -0.9,-1.053 -0.9,1.053 ; 0.9,-1.053 0.9,1.053
Top Assembly:
  lines w0.2: -0.6,-1.153 -0.6,1.153 0.6,1.153 0.6,-1.153 -0.6,-1.153
  text ".Designator" at 1.056,-0.432 h1
Top 3D Body:
  lines w0.2: -0.4,-0.8 -0.4,0.8 0.4,0.8 0.4,-0.8 -0.4,-0.8
Top Courtyard:
  lines w0.2: -0.6,-1.153 -0.6,1.153 0.6,1.153 0.6,-1.153 -0.6,-1.153
Top Component Center:
  lines w0.1: -0.5,0 0.5,0 ; 0,-0.5 0,0.5
3D body "Ind_Murata_DFE18SAN1R0ME0L_eec.STEP": height 0.25, standoff 0, extent -0.6,-1.153 0.6,1.153